# Altium footprint library PHANTOM_FOOTPRINTS.PcbLib: 49 footprints (part 4 of 4)
Each footprint in its own frame and in the unit in brackets; x right, y up, seen from the top. Pads: shape width x height; smd on the part's side, far side on the other; paste and mask are expansions set on the pad; w line width, h text height; cw(c..) or ccw(c..) is an arc to the next point about the centre after c.
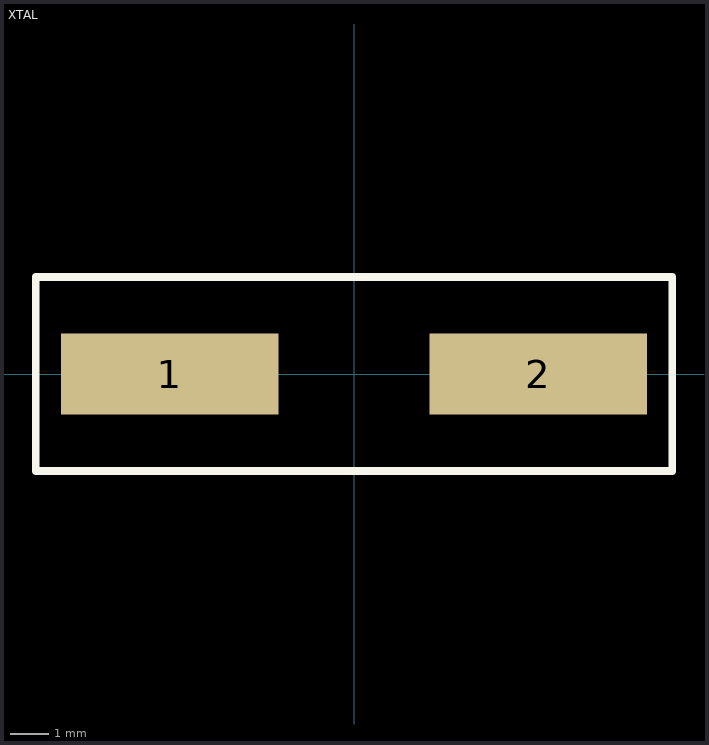
[diagram p3: the footprint, top view; thin cyan lines are the x and y axes]

## XTAL [mm]
pads (2):
  rect 5.6x2.1 smd: 1(-4.75,0) 2(4.75,0)
Top Overlay:
  lines w0.2: -8.2,-2.5 -8.2,0 -8.2,2.5 8.2,2.5 8.2,-2.5 -8.2,-2.5
3D body "ABLS2.STEP": height 3.16, standoff -0.1, extent -6.35,-2.349 6.35,2.35